# Altium footprint library XU-GENARAL PCB .PcbLib: 1176 footprints (part 25 of 75)
Each footprint in its own frame and in the unit in brackets; x right, y up, seen from the top. Pads: shape width x height; smd on the part's side, far side on the other; paste and mask are expansions set on the pad; w line width, h text height; cw(c..) or ccw(c..) is an arc to the next point about the centre after c.
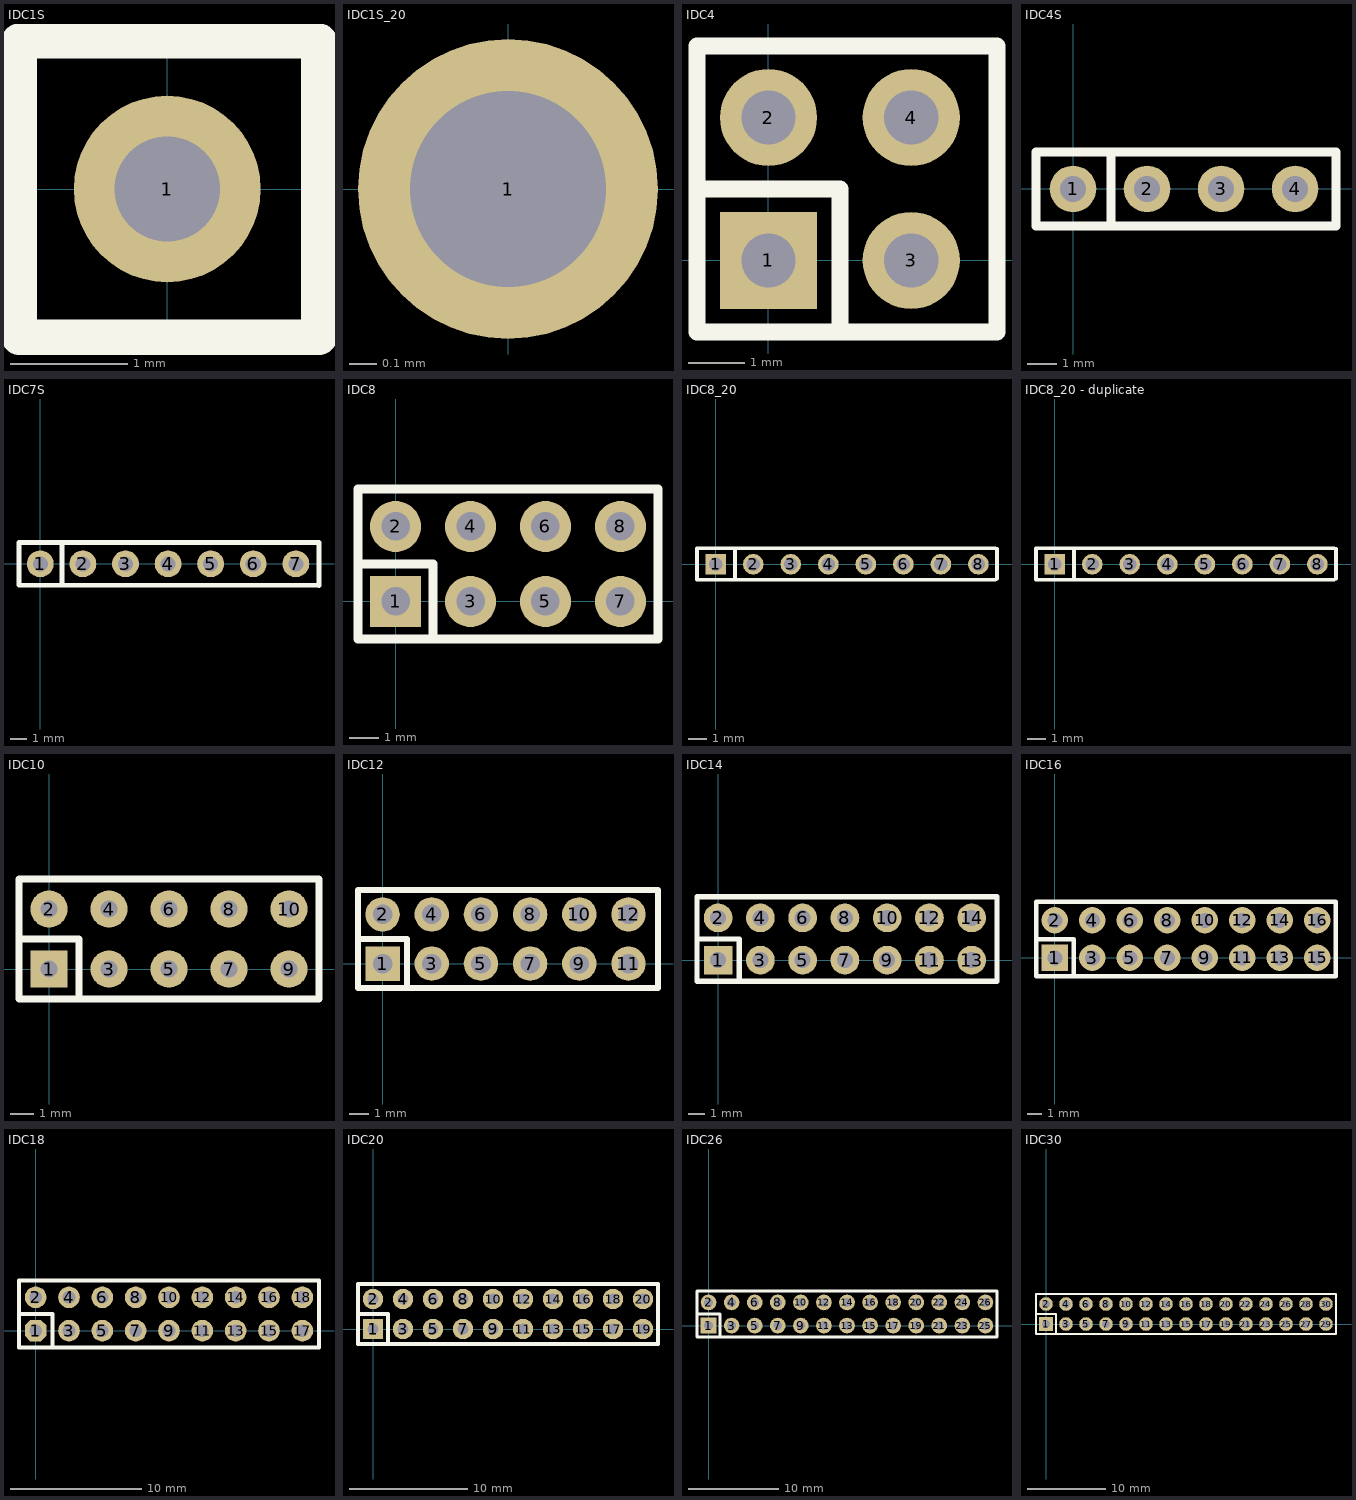
[diagram p24: the footprints below, top view; thin cyan lines are the x and y axes]

## IDC1S [mm]
pads (1):
  round 1.6 hole 0.9: 1(0,0)
Top Overlay:
  lines w0.305: -1.27,-1.27 1.3,-1.27 1.3,1.27 -1.27,1.27 -1.27,-1.27

## IDC1S_20 [mm]
pads (1):
  round 1.1 hole 0.72: 1(0,0)

## IDC4 [mil]
pads (4):
  rect 68x68 hole 38: 1(0,0)
  round 68 hole 38: 2(0,100) 3(100,0) 4(100,100)
Top Overlay:
  lines w12: -50,50 50,50 50,-50 ; -50,-50 160,-50 160,150 -50,150 -50,-50

## IDC4S [mm]
pads (4):
  round 1.6 hole 0.9: 1(0,0) 2(2.54,0) 3(5.08,0) 4(7.62,0)
Top Overlay:
  lines w0.305: 1.3,-1.27 1.3,1.27 ; -1.27,-1.27 -1.27,1.27 9.023,1.27 9.023,-1.275 -1.27,-1.27

## IDC7S [mm]
pads (7):
  round 1.6 hole 0.9: 1(0,0) 2(2.54,0) 3(5.08,0) 4(7.62,0) 5(10.16,0) 6(12.7,0) 7(15.24,0)
Top Overlay:
  lines w0.305: 1.3,-1.27 1.3,1.27 ; -1.27,-1.27 16.621,-1.29 16.621,1.27 -1.27,1.27 -1.27,-1.27

## IDC8 [mil]
pads (8):
  rect 68x68 hole 38: 1(0,0)
  round 68 hole 38: 2(0,100) 3(100,0) 4(100,100) 5(200,0) 6(200,100) 7(300,0) 8(300,100)
Top Overlay:
  lines w12: -50,50 50,50 50,-50 ; -50,-50 -50,150 350,150 350,-50 -50,-50

## IDC8_20 [mm]
pads (8):
  rect 1.1x1.1 hole 0.72: 1(0,0)
  round 1.1 hole 0.72: 2(2,0) 3(4,0) 4(6,0) 5(8,0) 6(10,0) 7(12,0) 8(14,0)
Top Overlay:
  lines w0.203: 1.025,-0.775 1.025,0.85 ; -1,-0.825 -1,0.85 14.896,0.85 14.996,0.83 14.996,-0.775 14.896,-0.825 -1,-0.825

## IDC8_20 - duplicate [mm]
pads (8):
  rect 1.1x1.1 hole 0.72: 1(0,0)
  round 1.1 hole 0.72: 2(2,0) 3(4,0) 4(6,0) 5(8,0) 6(10,0) 7(12,0) 8(14,0)
Top Overlay:
  lines w0.203: -1,0.825 -1,-0.825 14.896,-0.825 ; -1,0.85 14.896,0.85 ; 1.025,-0.775 1.025,0.85 ; 14.996,-0.775 14.996,0.83

## IDC10 [mil]
pads (10):
  rect 62x62 hole 28: 1(0,0)
  round 62 hole 28: 2(0,100) 3(100,0) 4(100,100) 5(200,0) 6(200,100) 7(300,0) 8(300,100) 9(400,0) 10(400,100)
Top Overlay:
  lines w12: -50,50 50,50 50,-50 ; -50,-50 -50,150 450,150 450,-50 -50,-50

## IDC12 [mil]
pads (12):
  rect 70x70 hole 40: 1(0,0)
  round 70 hole 40: 2(0,100) 3(100,0) 4(100,100) 5(200,0) 6(200,100) 7(300,0) 8(300,100) 9(400,0) 10(400,100) 11(500,0) 12(500,100)
Top Overlay:
  lines w12: -50,50 50,50 50,-50 ; -50,-50 560,-50 560,150 -50,150 -50,-50

## IDC14 [mil]
pads (14):
  rect 68x68 hole 38: 1(0,0)
  round 68 hole 38: 2(0,100) 3(100,0) 4(100,100) 5(200,0) 6(200,100) 7(300,0) 8(300,100) 9(400,0) 10(400,100) 11(500,0) 12(500,100) 13(600,0) 14(600,100)
Top Overlay:
  lines w12: -50,50 50,50 50,-50 ; -50,-50 660,-50 660,150 -50,150 -50,-50

## IDC16 [mil]
pads (16):
  rect 70x70 hole 40: 1(0,0)
  round 70 hole 40: 2(0,100) 3(100,0) 4(100,100) 5(200,0) 6(200,100) 7(300,0) 8(300,100) 9(400,0) 10(400,100) 11(500,0) 12(500,100) 13(600,0) 14(600,100) 15(700,0) 16(700,100)
Top Overlay:
  lines w12: -50,50 50,50 50,-50 ; -50,-50 -50,150 750,150 750,-50 -50,-50

## IDC18 [mil]
pads (18):
  oct 65x65 hole 38: 1(0,0)
  round 65 hole 38: 2(0,100) 3(100,0) 4(100,100) 5(200,0) 6(200,100) 7(300,0) 8(300,100) 9(400,0) 10(400,100) 11(500,0) 12(500,100) 13(600,0) 14(600,100) 15(700,0) 16(700,100) 17(800,0) 18(800,100)
Top Overlay:
  lines w12: -50,50 50,50 50,-50 ; -50,-50 -50,150 850,150 850,-50 -50,-50

## IDC20 [mil]
pads (20):
  rect 68x68 hole 38: 1(0,0)
  round 68 hole 38: 2(0,100) 3(100,0) 4(100,100) 5(200,0) 6(200,100) 7(300,0) 8(300,100) 9(400,0) 10(400,100) 11(500,0) 12(500,100) 13(600,0) 14(600,100) 15(700,0) 16(700,100) 17(800,0) 18(800,100) 19(900,0) 20(900,100)
Top Overlay:
  lines w12: -50,50 50,50 50,-50 ; -50,-50 950,-50 950,150 -50,150 -50,-50

## IDC26 [mil]
pads (26):
  rect 68x68 hole 38: 1(0,0)
  round 68 hole 38: 2(0,100) 3(100,0) 4(100,100) 5(200,0) 6(200,100) 7(300,0) 8(300,100) 9(400,0) 10(400,100) 11(500,0) 12(500,100) 13(600,0) 14(600,100) 15(700,0) 16(700,100) 17(800,0) 18(800,100) 19(900,0) 20(900,100) 21(1000,0) 22(1000,100) 23(1100,0) 24(1100,100) 25(1200,0) 26(1200,100)
Top Overlay:
  lines w12: -50,50 50,50 50,-50 ; -50,-50 1250,-50 1250,150 -50,150 -50,-50

## IDC30 [mil]
pads (30):
  rect 68x68 hole 38: 1(0,0)
  round 68 hole 38: 2(0,100) 3(100,0) 4(100,100) 5(200,0) 6(200,100) 7(300,0) 8(300,100) 9(400,0) 10(400,100) 11(500,0) 12(500,100) 13(600,0) 14(600,100) 15(700,0) 16(700,100) 17(800,0) 18(800,100) 19(900,0) 20(900,100) 21(1000,0) 22(1000,100) 23(1100,0) 24(1100,100) 25(1200,0) 26(1200,100) 27(1300,0) 28(1300,100) 29(1400,0) 30(1400,100)
Top Overlay:
  lines w12: -50,50 50,50 50,-50 ; -50,-50 -50,150 1450,150 1450,-50 -50,-50